# Altium integrated library Altium_WCAP-AIG8 (rev20b).IntLib: 36 symbols
Pins are listed as number, name and electrical type; pins without a type are passive.

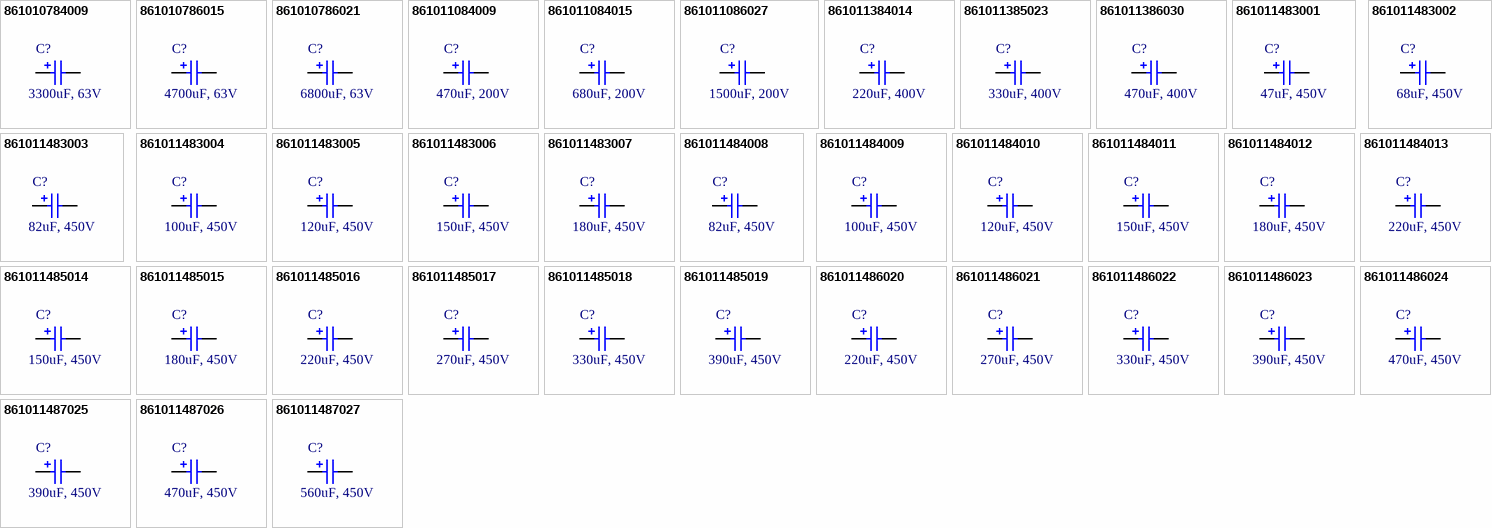
[diagram p0: symbols 861010784009 to 861011487027]

## 861010784009
designator C?, comment 3300uF, 63V
WCAP-AIG8 Aluminum Electrolytic Capacitor, Snap-In, THT, D25xH30mm, 3300uF, 63V; Manufacturer Part Number: 861010784009; Manufacturer: Wurth Elektronik; Technical Reference: ANBO300332M063DSIC3B000; Rated Voltage: 63VDC; Ripple Current: 3120mA; Leakage Current: 4158uA; Dissipation Factor: 20%; Endurance: 2000h; Capacitance Tolerance: +/-20%; Capacitance: 3300uF; Published Date: October 2020; Packaging: Tray; Operating Temperature: -40 to +85degC; Mounting Technology: THT; Height: 30mm; ComponentLink2Description: Datasheet; Diameter: 25mm; ComponentLink2URL: https://www.we-online.com/catalog/datasheet/861010784009.pdf; ComponentLink1URL: http://www.we-online.de; ComponentLink1Description: Manufacturer
footprint WCAP-AIG8_D25H30
pins: 1 P, 2 N

## 861010786015
designator C?, comment 4700uF, 63V
WCAP-AIG8 Aluminum Electrolytic Capacitor, Snap-In, THT, D35xH25mm, 4700uF, 63V; Manufacturer Part Number: 861010786015; Manufacturer: Wurth Elektronik; Technical Reference: ANBQ250472M063DSIC2B000; Rated Voltage: 63VDC; Ripple Current: 3280mA; Leakage Current: 5922uA; Dissipation Factor: 30%; Endurance: 2000h; Capacitance Tolerance: +/-20%; Capacitance: 4700uF; Published Date: October 2020; Packaging: Tray; Operating Temperature: -40 to +85degC; Mounting Technology: THT; Height: 25mm; ComponentLink2Description: Datasheet; Diameter: 35mm; ComponentLink2URL: https://www.we-online.com/catalog/datasheet/861010786015.pdf; ComponentLink1URL: http://www.we-online.de; ComponentLink1Description: Manufacturer
footprint WCAP-AIG8_D35H25
pins: 1 P, 2 N

## 861010786021
designator C?, comment 6800uF, 63V
WCAP-AIG8 Aluminum Electrolytic Capacitor, Snap-In, THT, D35xH30mm, 6800uF, 63V; Manufacturer Part Number: 861010786021; Manufacturer: Wurth Elektronik; Technical Reference: ANBQ300682M063DSIC2B000; Rated Voltage: 63VDC; Ripple Current: 4320mA; Leakage Current: 8568uA; Dissipation Factor: 30%; Endurance: 2000h; Capacitance Tolerance: +/-20%; Capacitance: 6800uF; Published Date: October 2020; Packaging: Tray; Operating Temperature: -40 to +85degC; Mounting Technology: THT; Height: 30mm; ComponentLink2Description: Datasheet; Diameter: 35mm; ComponentLink2URL: https://www.we-online.com/catalog/datasheet/861010786021.pdf; ComponentLink1URL: http://www.we-online.de; ComponentLink1Description: Manufacturer
footprint WCAP-AIG8_D35H30
pins: 1 P, 2 N

## 861011084009
designator C?, comment 470uF, 200V
WCAP-AIG8 Aluminum Electrolytic Capacitor, Snap-In, THT, D25xH25mm, 470uF, 200V; Manufacturer Part Number: 861011084009; Manufacturer: Wurth Elektronik; Technical Reference: ANAO250471M200DSIC3B000; Rated Voltage: 200VDC; Ripple Current: 2080mA; Leakage Current: 1880uA; Dissipation Factor: 15%; Endurance: 2000h; Capacitance Tolerance: +/-20%; Capacitance: 470uF; Published Date: October 2020; Packaging: Tray; Operating Temperature: -25 to +85degC; Mounting Technology: THT; Height: 25mm; ComponentLink2Description: Datasheet; Diameter: 25mm; ComponentLink2URL: https://www.we-online.com/catalog/datasheet/861011084009.pdf; ComponentLink1URL: http://www.we-online.de; ComponentLink1Description: Manufacturer
footprint WCAP-AIG8_D25H25
pins: 1 P, 2 N

## 861011084015
designator C?, comment 680uF, 200V
WCAP-AIG8 Aluminum Electrolytic Capacitor, Snap-In, THT, D25xH30mm, 680uF, 200V; Manufacturer Part Number: 861011084015; Manufacturer: Wurth Elektronik; Technical Reference: ANAO300681M200DSIC3B000; Rated Voltage: 200VDC; Ripple Current: 2980mA; Leakage Current: 2720uA; Dissipation Factor: 15%; Endurance: 2000h; Capacitance Tolerance: +/-20%; Capacitance: 680uF; Published Date: October 2020; Packaging: Tray; Operating Temperature: -25 to +85degC; Mounting Technology: THT; Height: 30mm; ComponentLink2Description: Datasheet; Diameter: 25mm; ComponentLink2URL: https://www.we-online.com/catalog/datasheet/861011084015.pdf; ComponentLink1URL: http://www.we-online.de; ComponentLink1Description: Manufacturer
footprint WCAP-AIG8_D25H30
pins: 1 P, 2 N

## 861011086027
designator C?, comment 1500uF, 200V
WCAP-AIG8 Aluminum Electrolytic Capacitor, Snap-In, THT, D35xH35mm, 1500uF, 200V; Manufacturer Part Number: 861011086027; Manufacturer: Wurth Elektronik; Technical Reference: ANAQ350152M200DSIC2B000; Rated Voltage: 200VDC; Ripple Current: 4770mA; Leakage Current: 6000uA; Dissipation Factor: 15%; Endurance: 2000h; Capacitance Tolerance: +/-20%; Capacitance: 1500uF; Published Date: October 2020; Packaging: Tray; Operating Temperature: -25 to +85degC; Mounting Technology: THT; Height: 35mm; ComponentLink2Description: Datasheet; Diameter: 35mm; ComponentLink2URL: https://www.we-online.com/catalog/datasheet/861011086027.pdf; ComponentLink1URL: http://www.we-online.de; ComponentLink1Description: Manufacturer
footprint WCAP-AIG8_D35H35
pins: 1 P, 2 N

## 861011384014
designator C?, comment 220uF, 400V
WCAP-AIG8 Aluminum Electrolytic Capacitor, Snap-In, THT, D25xH30mm, 220uF, 400V; Manufacturer Part Number: 861011384014; Manufacturer: Wurth Elektronik; Technical Reference: ANAO300221M400DSIC3B000; Rated Voltage: 400VDC; Ripple Current: 1550mA; Leakage Current: 1760uA; Dissipation Factor: 20%; Endurance: 2000h; Capacitance Tolerance: +/-20%; Capacitance: 220uF; Published Date: October 2020; Packaging: Tray; Operating Temperature: -25 to +85degC; Mounting Technology: THT; Height: 30mm; ComponentLink2Description: Datasheet; Diameter: 25mm; ComponentLink2URL: https://www.we-online.com/catalog/datasheet/861011384014.pdf; ComponentLink1URL: http://www.we-online.de; ComponentLink1Description: Manufacturer
footprint WCAP-AIG8_D25H30
pins: 1 P, 2 N

## 861011385023
designator C?, comment 330uF, 400V
WCAP-AIG8 Aluminum Electrolytic Capacitor, Snap-In, THT, D30xH30mm, 330uF, 400V; Manufacturer Part Number: 861011385023; Manufacturer: Wurth Elektronik; Technical Reference: ANAP300331M400DSIC2B000; Rated Voltage: 400VDC; Ripple Current: 2050mA; Leakage Current: 2640uA; Dissipation Factor: 20%; Endurance: 2000h; Capacitance Tolerance: +/-20%; Capacitance: 330uF; Published Date: October 2020; Packaging: Tray; Operating Temperature: -25 to +85degC; Mounting Technology: THT; Height: 30mm; ComponentLink2Description: Datasheet; Diameter: 30mm; ComponentLink2URL: https://www.we-online.com/catalog/datasheet/861011385023.pdf; ComponentLink1URL: http://www.we-online.de; ComponentLink1Description: Manufacturer
footprint WCAP-AIG8_D30H30
pins: 1 P, 2 N

## 861011386030
designator C?, comment 470uF, 400V
WCAP-AIG8 Aluminum Electrolytic Capacitor, Snap-In, THT, D35xH35mm, 470uF, 400V; Manufacturer Part Number: 861011386030; Manufacturer: Wurth Elektronik; Technical Reference: ANAQ350471M400DSIC2B000; Rated Voltage: 400VDC; Ripple Current: 2420mA; Leakage Current: 3760uA; Dissipation Factor: 20%; Endurance: 2000h; Capacitance Tolerance: +/-20%; Capacitance: 470uF; Published Date: October 2020; Packaging: Tray; Operating Temperature: -25 to +85degC; Mounting Technology: THT; Height: 35mm; ComponentLink2Description: Datasheet; Diameter: 35mm; ComponentLink2URL: https://www.we-online.com/catalog/datasheet/861011386030.pdf; ComponentLink1URL: http://www.we-online.de; ComponentLink1Description: Manufacturer
footprint WCAP-AIG8_D35H35
pins: 1 P, 2 N

## 861011483001
designator C?, comment 47uF, 450V
WCAP-AIG8 Aluminum Electrolytic Capacitor, Snap-In, THT, D22xH26mm, 47uF, 450V; Manufacturer Part Number: 861011483001; Manufacturer: Wurth Elektronik; Technical Reference: ANAN260470M450DSIC3B000; Rated Voltage: 450VDC; Ripple Current: 360mA; Leakage Current: 423uA; Dissipation Factor: 20%; Endurance: 2000h; Capacitance Tolerance: +/-20%; Capacitance: 47uF; Published Date: October 2020; Packaging: Tray; Operating Temperature: -25 to +85degC; Mounting Technology: THT; Height: 26mm; ComponentLink2Description: Datasheet; Diameter: 22mm; ComponentLink2URL: https://www.we-online.com/catalog/datasheet/861011483001.pdf; ComponentLink1URL: http://www.we-online.de; ComponentLink1Description: Manufacturer
footprint WCAP-AIG8_D22H26
pins: 1 P, 2 N

## 861011483002
designator C?, comment 68uF, 450V
WCAP-AIG8 Aluminum Electrolytic Capacitor, Snap-In, THT, D22xH31mm, 68uF, 450V; Manufacturer Part Number: 861011483002; Manufacturer: Wurth Elektronik; Technical Reference: ANAN310680M450DSIC3B000; Rated Voltage: 450VDC; Ripple Current: 500mA; Leakage Current: 612uA; Dissipation Factor: 20%; Endurance: 2000h; Capacitance Tolerance: +/-20%; Capacitance: 68uF; Published Date: October 2020; Packaging: Tray; Operating Temperature: -25 to +85degC; Mounting Technology: THT; Height: 31mm; ComponentLink2Description: Datasheet; Diameter: 22mm; ComponentLink2URL: https://www.we-online.com/catalog/datasheet/861011483002.pdf; ComponentLink1URL: http://www.we-online.de; ComponentLink1Description: Manufacturer
footprint WCAP-AIG8_D22H31
pins: 1 P, 2 N

## 861011483003
designator C?, comment 82uF, 450V
WCAP-AIG8 Aluminum Electrolytic Capacitor, Snap-In, THT, D22xH31mm, 82uF, 450V; Manufacturer Part Number: 861011483003; Manufacturer: Wurth Elektronik; Technical Reference: ANAN310820M450DSIC3B000; Rated Voltage: 450VDC; Ripple Current: 890mA; Leakage Current: 738uA; Dissipation Factor: 20%; Endurance: 2000h; Capacitance Tolerance: +/-20%; Capacitance: 82uF; Published Date: October 2020; Packaging: Tray; Operating Temperature: -25 to +85degC; Mounting Technology: THT; Height: 31mm; ComponentLink2Description: Datasheet; Diameter: 22mm; ComponentLink2URL: https://www.we-online.com/catalog/datasheet/861011483003.pdf; ComponentLink1URL: http://www.we-online.de; ComponentLink1Description: Manufacturer
footprint WCAP-AIG8_D22H31
pins: 1 P, 2 N

## 861011483004
designator C?, comment 100uF, 450V
WCAP-AIG8 Aluminum Electrolytic Capacitor, Snap-In, THT, D22xH36mm, 100uF, 450V; Manufacturer Part Number: 861011483004; Manufacturer: Wurth Elektronik; Technical Reference: ANAN360101M450DSIC3B000; Rated Voltage: 450VDC; Ripple Current: 1030mA; Leakage Current: 900uA; Dissipation Factor: 20%; Endurance: 2000h; Capacitance Tolerance: +/-20%; Capacitance: 100uF; Published Date: October 2020; Packaging: Tray; Operating Temperature: -25 to +85degC; Mounting Technology: THT; Height: 36mm; ComponentLink2Description: Datasheet; Diameter: 22mm; ComponentLink2URL: https://www.we-online.com/catalog/datasheet/861011483004.pdf; ComponentLink1URL: http://www.we-online.de; ComponentLink1Description: Manufacturer
footprint WCAP-AIG8_D22H36
pins: 1 P, 2 N

## 861011483005
designator C?, comment 120uF, 450V
WCAP-AIG8 Aluminum Electrolytic Capacitor, Snap-In, THT, D22xH41mm, 120uF, 450V; Manufacturer Part Number: 861011483005; Manufacturer: Wurth Elektronik; Technical Reference: ANAN410121M450DSIC3B000; Rated Voltage: 450VDC; Ripple Current: 1190mA; Leakage Current: 1080uA; Dissipation Factor: 20%; Endurance: 2000h; Capacitance Tolerance: +/-20%; Capacitance: 120uF; Published Date: October 2020; Packaging: Tray; Operating Temperature: -25 to +85degC; Mounting Technology: THT; Height: 41mm; ComponentLink2Description: Datasheet; Diameter: 22mm; ComponentLink2URL: https://www.we-online.com/catalog/datasheet/861011483005.pdf; ComponentLink1URL: http://www.we-online.de; ComponentLink1Description: Manufacturer
footprint WCAP-AIG8_D22H41
pins: 1 P, 2 N

## 861011483006
designator C?, comment 150uF, 450V
WCAP-AIG8 Aluminum Electrolytic Capacitor, Snap-In, THT, D22xH51mm, 150uF, 450V; Manufacturer Part Number: 861011483006; Manufacturer: Wurth Elektronik; Technical Reference: ANAN510151M450DSIC3B000; Rated Voltage: 450VDC; Ripple Current: 1390mA; Leakage Current: 1350uA; Dissipation Factor: 20%; Endurance: 2000h; Capacitance Tolerance: +/-20%; Capacitance: 150uF; Published Date: October 2020; Packaging: Tray; Operating Temperature: -25 to +85degC; Mounting Technology: THT; Height: 51mm; ComponentLink2Description: Datasheet; Diameter: 22mm; ComponentLink2URL: https://www.we-online.com/catalog/datasheet/861011483006.pdf; ComponentLink1URL: http://www.we-online.de; ComponentLink1Description: Manufacturer
footprint WCAP-AIG8_D22H51
pins: 1 P, 2 N

## 861011483007
designator C?, comment 180uF, 450V
WCAP-AIG8 Aluminum Electrolytic Capacitor, Snap-In, THT, D22xH51mm, 180uF, 450V; Manufacturer Part Number: 861011483007; Manufacturer: Wurth Elektronik; Technical Reference: ANAN510181M450DSIC3B000; Rated Voltage: 450VDC; Ripple Current: 1520mA; Leakage Current: 1620uA; Dissipation Factor: 20%; Endurance: 2000h; Capacitance Tolerance: +/-20%; Capacitance: 180uF; Published Date: October 2020; Packaging: Tray; Operating Temperature: -25 to +85degC; Mounting Technology: THT; Height: 51mm; ComponentLink2Description: Datasheet; Diameter: 22mm; ComponentLink2URL: https://www.we-online.com/catalog/datasheet/861011483007.pdf; ComponentLink1URL: http://www.we-online.de; ComponentLink1Description: Manufacturer
footprint WCAP-AIG8_D22H51
pins: 1 P, 2 N

## 861011484008
designator C?, comment 82uF, 450V
WCAP-AIG8 Aluminum Electrolytic Capacitor, Snap-In, THT, D25xH26mm, 82uF, 450V; Manufacturer Part Number: 861011484008; Manufacturer: Wurth Elektronik; Technical Reference: ANAO260820M450DSIC3B000; Rated Voltage: 450VDC; Ripple Current: 890mA; Leakage Current: 738uA; Dissipation Factor: 20%; Endurance: 2000h; Capacitance Tolerance: +/-20%; Capacitance: 82uF; Published Date: October 2020; Packaging: Tray; Operating Temperature: -25 to +85degC; Mounting Technology: THT; Height: 26mm; ComponentLink2Description: Datasheet; Diameter: 25mm; ComponentLink2URL: https://www.we-online.com/catalog/datasheet/861011484008.pdf; ComponentLink1URL: http://www.we-online.de; ComponentLink1Description: Manufacturer
footprint WCAP-AIG8_D25H26
pins: 1 P, 2 N

## 861011484009
designator C?, comment 100uF, 450V
WCAP-AIG8 Aluminum Electrolytic Capacitor, Snap-In, THT, D25xH31mm, 100uF, 450V; Manufacturer Part Number: 861011484009; Manufacturer: Wurth Elektronik; Technical Reference: ANAO310101M450DSIC3B000; Rated Voltage: 450VDC; Ripple Current: 1030mA; Leakage Current: 900uA; Dissipation Factor: 20%; Endurance: 2000h; Capacitance Tolerance: +/-20%; Capacitance: 100uF; Published Date: October 2020; Packaging: Tray; Operating Temperature: -25 to +85degC; Mounting Technology: THT; Height: 31mm; ComponentLink2Description: Datasheet; Diameter: 25mm; ComponentLink2URL: https://www.we-online.com/catalog/datasheet/861011484009.pdf; ComponentLink1URL: http://www.we-online.de; ComponentLink1Description: Manufacturer
footprint WCAP-AIG8_D25H31
pins: 1 P, 2 N

## 861011484010
designator C?, comment 120uF, 450V
WCAP-AIG8 Aluminum Electrolytic Capacitor, Snap-In, THT, D25xH36mm, 120uF, 450V; Manufacturer Part Number: 861011484010; Manufacturer: Wurth Elektronik; Technical Reference: ANAO360121M450DSIC3B000; Rated Voltage: 450VDC; Ripple Current: 1190mA; Leakage Current: 1080uA; Dissipation Factor: 20%; Endurance: 2000h; Capacitance Tolerance: +/-20%; Capacitance: 120uF; Published Date: October 2020; Packaging: Tray; Operating Temperature: -25 to +85degC; Mounting Technology: THT; Height: 36mm; ComponentLink2Description: Datasheet; Diameter: 25mm; ComponentLink2URL: https://www.we-online.com/catalog/datasheet/861011484010.pdf; ComponentLink1URL: http://www.we-online.de; ComponentLink1Description: Manufacturer
footprint WCAP-AIG8_D25H36
pins: 1 P, 2 N

## 861011484011
designator C?, comment 150uF, 450V
WCAP-AIG8 Aluminum Electrolytic Capacitor, Snap-In, THT, D25xH41mm, 150uF, 450V; Manufacturer Part Number: 861011484011; Manufacturer: Wurth Elektronik; Technical Reference: ANAO410151M450DSIC3B000; Rated Voltage: 450VDC; Ripple Current: 1390mA; Leakage Current: 1350uA; Dissipation Factor: 20%; Endurance: 2000h; Capacitance Tolerance: +/-20%; Capacitance: 150uF; Published Date: October 2020; Packaging: Tray; Operating Temperature: -25 to +85degC; Mounting Technology: THT; Height: 41mm; ComponentLink2Description: Datasheet; Diameter: 25mm; ComponentLink2URL: https://www.we-online.com/catalog/datasheet/861011484011.pdf; ComponentLink1URL: http://www.we-online.de; ComponentLink1Description: Manufacturer
footprint WCAP-AIG8_D25H41
pins: 1 P, 2 N

## 861011484012
designator C?, comment 180uF, 450V
WCAP-AIG8 Aluminum Electrolytic Capacitor, Snap-In, THT, D25xH46mm, 180uF, 450V; Manufacturer Part Number: 861011484012; Manufacturer: Wurth Elektronik; Technical Reference: ANAO460181M450DSIC3B000; Rated Voltage: 450VDC; Ripple Current: 1520mA; Leakage Current: 1620uA; Dissipation Factor: 20%; Endurance: 2000h; Capacitance Tolerance: +/-20%; Capacitance: 180uF; Published Date: October 2020; Packaging: Tray; Operating Temperature: -25 to +85degC; Mounting Technology: THT; Height: 46mm; ComponentLink2Description: Datasheet; Diameter: 25mm; ComponentLink2URL: https://www.we-online.com/catalog/datasheet/861011484012.pdf; ComponentLink1URL: http://www.we-online.de; ComponentLink1Description: Manufacturer
footprint WCAP-AIG8_D25H46
pins: 1 P, 2 N

## 861011484013
designator C?, comment 220uF, 450V
WCAP-AIG8 Aluminum Electrolytic Capacitor, Snap-In, THT, D25xH51mm, 220uF, 450V; Manufacturer Part Number: 861011484013; Manufacturer: Wurth Elektronik; Technical Reference: ANAO510221M450DSIC3B000; Rated Voltage: 450VDC; Ripple Current: 1760mA; Leakage Current: 1980uA; Dissipation Factor: 20%; Endurance: 2000h; Capacitance Tolerance: +/-20%; Capacitance: 220uF; Published Date: October 2020; Packaging: Tray; Operating Temperature: -25 to +85degC; Mounting Technology: THT; Height: 51mm; ComponentLink2Description: Datasheet; Diameter: 25mm; ComponentLink2URL: https://www.we-online.com/catalog/datasheet/861011484013.pdf; ComponentLink1URL: http://www.we-online.de; ComponentLink1Description: Manufacturer
footprint WCAP-AIG8_D25H51
pins: 1 P, 2 N

## 861011485014
designator C?, comment 150uF, 450V
WCAP-AIG8 Aluminum Electrolytic Capacitor, Snap-In, THT, D30xH31mm, 150uF, 450V; Manufacturer Part Number: 861011485014; Manufacturer: Wurth Elektronik; Technical Reference: ANAP310151M450DSIC2B000; Rated Voltage: 450VDC; Ripple Current: 1390mA; Leakage Current: 1350uA; Dissipation Factor: 20%; Endurance: 2000h; Capacitance Tolerance: +/-20%; Capacitance: 150uF; Published Date: October 2020; Packaging: Tray; Operating Temperature: -25 to +85degC; Mounting Technology: THT; Height: 31mm; ComponentLink2Description: Datasheet; Diameter: 30mm; ComponentLink2URL: https://www.we-online.com/catalog/datasheet/861011485014.pdf; ComponentLink1URL: http://www.we-online.de; ComponentLink1Description: Manufacturer
footprint WCAP-AIG8_D30H31
pins: 1 P, 2 N

## 861011485015
designator C?, comment 180uF, 450V
WCAP-AIG8 Aluminum Electrolytic Capacitor, Snap-In, THT, D30xH36mm, 180uF, 450V; Manufacturer Part Number: 861011485015; Manufacturer: Wurth Elektronik; Technical Reference: ANAP360181M450DSIC2B000; Rated Voltage: 450VDC; Ripple Current: 1520mA; Leakage Current: 1620uA; Dissipation Factor: 20%; Endurance: 2000h; Capacitance Tolerance: +/-20%; Capacitance: 180uF; Published Date: October 2020; Packaging: Tray; Operating Temperature: -25 to +85degC; Mounting Technology: THT; Height: 36mm; ComponentLink2Description: Datasheet; Diameter: 30mm; ComponentLink2URL: https://www.we-online.com/catalog/datasheet/861011485015.pdf; ComponentLink1URL: http://www.we-online.de; ComponentLink1Description: Manufacturer
footprint WCAP-AIG8_D30H36
pins: 1 P, 2 N

## 861011485016
designator C?, comment 220uF, 450V
WCAP-AIG8 Aluminum Electrolytic Capacitor, Snap-In, THT, D30xH41mm, 220uF, 450V; Manufacturer Part Number: 861011485016; Manufacturer: Wurth Elektronik; Technical Reference: ANAP410221M450DSIC2B000; Rated Voltage: 450VDC; Ripple Current: 1760mA; Leakage Current: 1980uA; Dissipation Factor: 20%; Endurance: 2000h; Capacitance Tolerance: +/-20%; Capacitance: 220uF; Published Date: October 2020; Packaging: Tray; Operating Temperature: -25 to +85degC; Mounting Technology: THT; Height: 41mm; ComponentLink2Description: Datasheet; Diameter: 30mm; ComponentLink2URL: https://www.we-online.com/catalog/datasheet/861011485016.pdf; ComponentLink1URL: http://www.we-online.de; ComponentLink1Description: Manufacturer
footprint WCAP-AIG8_D30H41
pins: 1 P, 2 N

## 861011485017
designator C?, comment 270uF, 450V
WCAP-AIG8 Aluminum Electrolytic Capacitor, Snap-In, THT, D30xH46mm, 270uF, 450V; Manufacturer Part Number: 861011485017; Manufacturer: Wurth Elektronik; Technical Reference: ANAP460271M450DSIC2B000; Rated Voltage: 450VDC; Ripple Current: 2000mA; Leakage Current: 2430uA; Dissipation Factor: 20%; Endurance: 2000h; Capacitance Tolerance: +/-20%; Capacitance: 270uF; Published Date: October 2020; Packaging: Tray; Operating Temperature: -25 to +85degC; Mounting Technology: THT; Height: 46mm; ComponentLink2Description: Datasheet; Diameter: 30mm; ComponentLink2URL: https://www.we-online.com/catalog/datasheet/861011485017.pdf; ComponentLink1URL: http://www.we-online.de; ComponentLink1Description: Manufacturer
footprint WCAP-AIG8_D30H46
pins: 1 P, 2 N

## 861011485018
designator C?, comment 330uF, 450V
WCAP-AIG8 Aluminum Electrolytic Capacitor, Snap-In, THT, D30xH46mm, 330uF, 450V; Manufacturer Part Number: 861011485018; Manufacturer: Wurth Elektronik; Technical Reference: ANAP460331M450DSIC2B000; Rated Voltage: 450VDC; Ripple Current: 2290mA; Leakage Current: 2970uA; Dissipation Factor: 20%; Endurance: 2000h; Capacitance Tolerance: +/-20%; Capacitance: 330uF; Published Date: October 2020; Packaging: Tray; Operating Temperature: -25 to +85degC; Mounting Technology: THT; Height: 46mm; ComponentLink2Description: Datasheet; Diameter: 30mm; ComponentLink2URL: https://www.we-online.com/catalog/datasheet/861011485018.pdf; ComponentLink1URL: http://www.we-online.de; ComponentLink1Description: Manufacturer
footprint WCAP-AIG8_D30H46
pins: 1 P, 2 N

## 861011485019
designator C?, comment 390uF, 450V
WCAP-AIG8 Aluminum Electrolytic Capacitor, Snap-In, THT, D30xH46mm, 390uF, 450V; Manufacturer Part Number: 861011485019; Manufacturer: Wurth Elektronik; Technical Reference: ANAP460391M450DSIC2B000; Rated Voltage: 450VDC; Ripple Current: 2540mA; Leakage Current: 3510uA; Dissipation Factor: 20%; Endurance: 2000h; Capacitance Tolerance: +/-20%; Capacitance: 390uF; Published Date: October 2020; Packaging: Tray; Operating Temperature: -25 to +85degC; Mounting Technology: THT; Height: 46mm; ComponentLink2Description: Datasheet; Diameter: 30mm; ComponentLink2URL: https://www.we-online.com/catalog/datasheet/861011485019.pdf; ComponentLink1URL: http://www.we-online.de; ComponentLink1Description: Manufacturer
footprint WCAP-AIG8_D30H46
pins: 1 P, 2 N

## 861011486020
designator C?, comment 220uF, 450V
WCAP-AIG8 Aluminum Electrolytic Capacitor, Snap-In, THT, D35xH37mm, 220uF, 450V; Manufacturer Part Number: 861011486020; Manufacturer: Wurth Elektronik; Technical Reference: ANAQ370221M450DSIC2B000; Rated Voltage: 450VDC; Ripple Current: 1760mA; Leakage Current: 1980uA; Dissipation Factor: 20%; Endurance: 2000h; Capacitance Tolerance: +/-20%; Capacitance: 220uF; Published Date: October 2020; Packaging: Tray; Operating Temperature: -25 to +85degC; Mounting Technology: THT; Height: 37mm; ComponentLink2Description: Datasheet; Diameter: 35mm; ComponentLink2URL: https://www.we-online.com/catalog/datasheet/861011486020.pdf; ComponentLink1URL: http://www.we-online.de; ComponentLink1Description: Manufacturer
footprint WCAP-AIG8_D35H37
pins: 1 P, 2 N

## 861011486021
designator C?, comment 270uF, 450V
WCAP-AIG8 Aluminum Electrolytic Capacitor, Snap-In, THT, D35xH37mm, 270uF, 450V; Manufacturer Part Number: 861011486021; Manufacturer: Wurth Elektronik; Technical Reference: ANAQ370271M450DSIC2B000; Rated Voltage: 450VDC; Ripple Current: 2000mA; Leakage Current: 2430uA; Dissipation Factor: 20%; Endurance: 2000h; Capacitance Tolerance: +/-20%; Capacitance: 270uF; Published Date: October 2020; Packaging: Tray; Operating Temperature: -25 to +85degC; Mounting Technology: THT; Height: 37mm; ComponentLink2Description: Datasheet; Diameter: 35mm; ComponentLink2URL: https://www.we-online.com/catalog/datasheet/861011486021.pdf; ComponentLink1URL: http://www.we-online.de; ComponentLink1Description: Manufacturer
footprint WCAP-AIG8_D35H37
pins: 1 P, 2 N

## 861011486022
designator C?, comment 330uF, 450V
WCAP-AIG8 Aluminum Electrolytic Capacitor, Snap-In, THT, D35xH37mm, 330uF, 450V; Manufacturer Part Number: 861011486022; Manufacturer: Wurth Elektronik; Technical Reference: ANAQ370331M450DSIC2B000; Rated Voltage: 450VDC; Ripple Current: 2290mA; Leakage Current: 2970uA; Dissipation Factor: 20%; Endurance: 2000h; Capacitance Tolerance: +/-20%; Capacitance: 330uF; Published Date: October 2020; Packaging: Tray; Operating Temperature: -25 to +85degC; Mounting Technology: THT; Height: 37mm; ComponentLink2Description: Datasheet; Diameter: 35mm; ComponentLink2URL: https://www.we-online.com/catalog/datasheet/861011486022.pdf; ComponentLink1URL: http://www.we-online.de; ComponentLink1Description: Manufacturer
footprint WCAP-AIG8_D35H37
pins: 1 P, 2 N

## 861011486023
designator C?, comment 390uF, 450V
WCAP-AIG8 Aluminum Electrolytic Capacitor, Snap-In, THT, D35xH42mm, 390uF, 450V; Manufacturer Part Number: 861011486023; Manufacturer: Wurth Elektronik; Technical Reference: ANAQ420391M450DSIC2B000; Rated Voltage: 450VDC; Ripple Current: 2540mA; Leakage Current: 3510uA; Dissipation Factor: 20%; Endurance: 2000h; Capacitance Tolerance: +/-20%; Capacitance: 390uF; Published Date: October 2020; Packaging: Tray; Operating Temperature: -25 to +85degC; Mounting Technology: THT; Height: 42mm; ComponentLink2Description: Datasheet; Diameter: 35mm; ComponentLink2URL: https://www.we-online.com/catalog/datasheet/861011486023.pdf; ComponentLink1URL: http://www.we-online.de; ComponentLink1Description: Manufacturer
footprint WCAP-AIG8_D35H42
pins: 1 P, 2 N

## 861011486024
designator C?, comment 470uF, 450V
WCAP-AIG8 Aluminum Electrolytic Capacitor, Snap-In, THT, D35xH47mm, 470uF, 450V; Manufacturer Part Number: 861011486024; Manufacturer: Wurth Elektronik; Technical Reference: ANAQ470471M450DSIC2B000; Rated Voltage: 450VDC; Ripple Current: 2890mA; Leakage Current: 4230uA; Dissipation Factor: 20%; Endurance: 2000h; Capacitance Tolerance: +/-20%; Capacitance: 470uF; Published Date: October 2020; Packaging: Tray; Operating Temperature: -25 to +85degC; Mounting Technology: THT; Height: 47mm; ComponentLink2Description: Datasheet; Diameter: 35mm; ComponentLink2URL: https://www.we-online.com/catalog/datasheet/861011486024.pdf; ComponentLink1URL: http://www.we-online.de; ComponentLink1Description: Manufacturer
footprint WCAP-AIG8_D35H47
pins: 1 P, 2 N

## 861011487025
designator C?, comment 390uF, 450V
WCAP-AIG8 Aluminum Electrolytic Capacitor, Snap-In, THT, D40xH37mm, 390uF, 450V; Manufacturer Part Number: 861011487025; Manufacturer: Wurth Elektronik; Technical Reference: ANAR370391M450DSIC1B000; Rated Voltage: 450VDC; Ripple Current: 2540mA; Leakage Current: 3510uA; Dissipation Factor: 20%; Endurance: 2000h; Capacitance Tolerance: +/-20%; Capacitance: 390uF; Published Date: October 2020; Packaging: Tray; Operating Temperature: -25 to +85degC; Mounting Technology: THT; Height: 37mm; ComponentLink2Description: Datasheet; Diameter: 40mm; ComponentLink2URL: https://www.we-online.com/catalog/datasheet/861011487025.pdf; ComponentLink1URL: http://www.we-online.de; ComponentLink1Description: Manufacturer
footprint WCAP-AIG8_D40H37
pins: 1 P, 2 N

## 861011487026
designator C?, comment 470uF, 450V
WCAP-AIG8 Aluminum Electrolytic Capacitor, Snap-In, THT, D40xH42mm, 470uF, 450V; Manufacturer Part Number: 861011487026; Manufacturer: Wurth Elektronik; Technical Reference: ANAR420471M450DSIC1B000; Rated Voltage: 450VDC; Ripple Current: 2890mA; Leakage Current: 4230uA; Dissipation Factor: 20%; Endurance: 2000h; Capacitance Tolerance: +/-20%; Capacitance: 470uF; Published Date: October 2020; Packaging: Tray; Operating Temperature: -25 to +85degC; Mounting Technology: THT; Height: 42mm; ComponentLink2Description: Datasheet; Diameter: 40mm; ComponentLink2URL: https://www.we-online.com/catalog/datasheet/861011487026.pdf; ComponentLink1URL: http://www.we-online.de; ComponentLink1Description: Manufacturer
footprint WCAP-AIG8_D40H42
pins: 1 P, 2 N

## 861011487027
designator C?, comment 560uF, 450V
WCAP-AIG8 Aluminum Electrolytic Capacitor, Snap-In, THT, D40xH52mm, 560uF, 450V; Manufacturer Part Number: 861011487027; Manufacturer: Wurth Elektronik; Technical Reference: ANAR520561M450DSIC1B000; Rated Voltage: 450VDC; Ripple Current: 3260mA; Leakage Current: 5040uA; Dissipation Factor: 20%; Endurance: 2000h; Capacitance Tolerance: +/-20%; Capacitance: 560uF; Published Date: October 2020; Packaging: Tray; Operating Temperature: -25 to +85degC; Mounting Technology: THT; Height: 52mm; ComponentLink2Description: Datasheet; Diameter: 40mm; ComponentLink2URL: https://www.we-online.com/catalog/datasheet/861011487027.pdf; ComponentLink1URL: http://www.we-online.de; ComponentLink1Description: Manufacturer
footprint WCAP-AIG8_D40H52
pins: 1 P, 2 N